# Altium footprint library разъёмы.PcbLib: 129 footprints (part 7 of 9)
Each footprint in its own frame and in the unit in brackets; x right, y up, seen from the top. Pads: shape width x height; smd on the part's side, far side on the other; paste and mask are expansions set on the pad; w line width, h text height; cw(c..) or ccw(c..) is an arc to the next point about the centre after c.
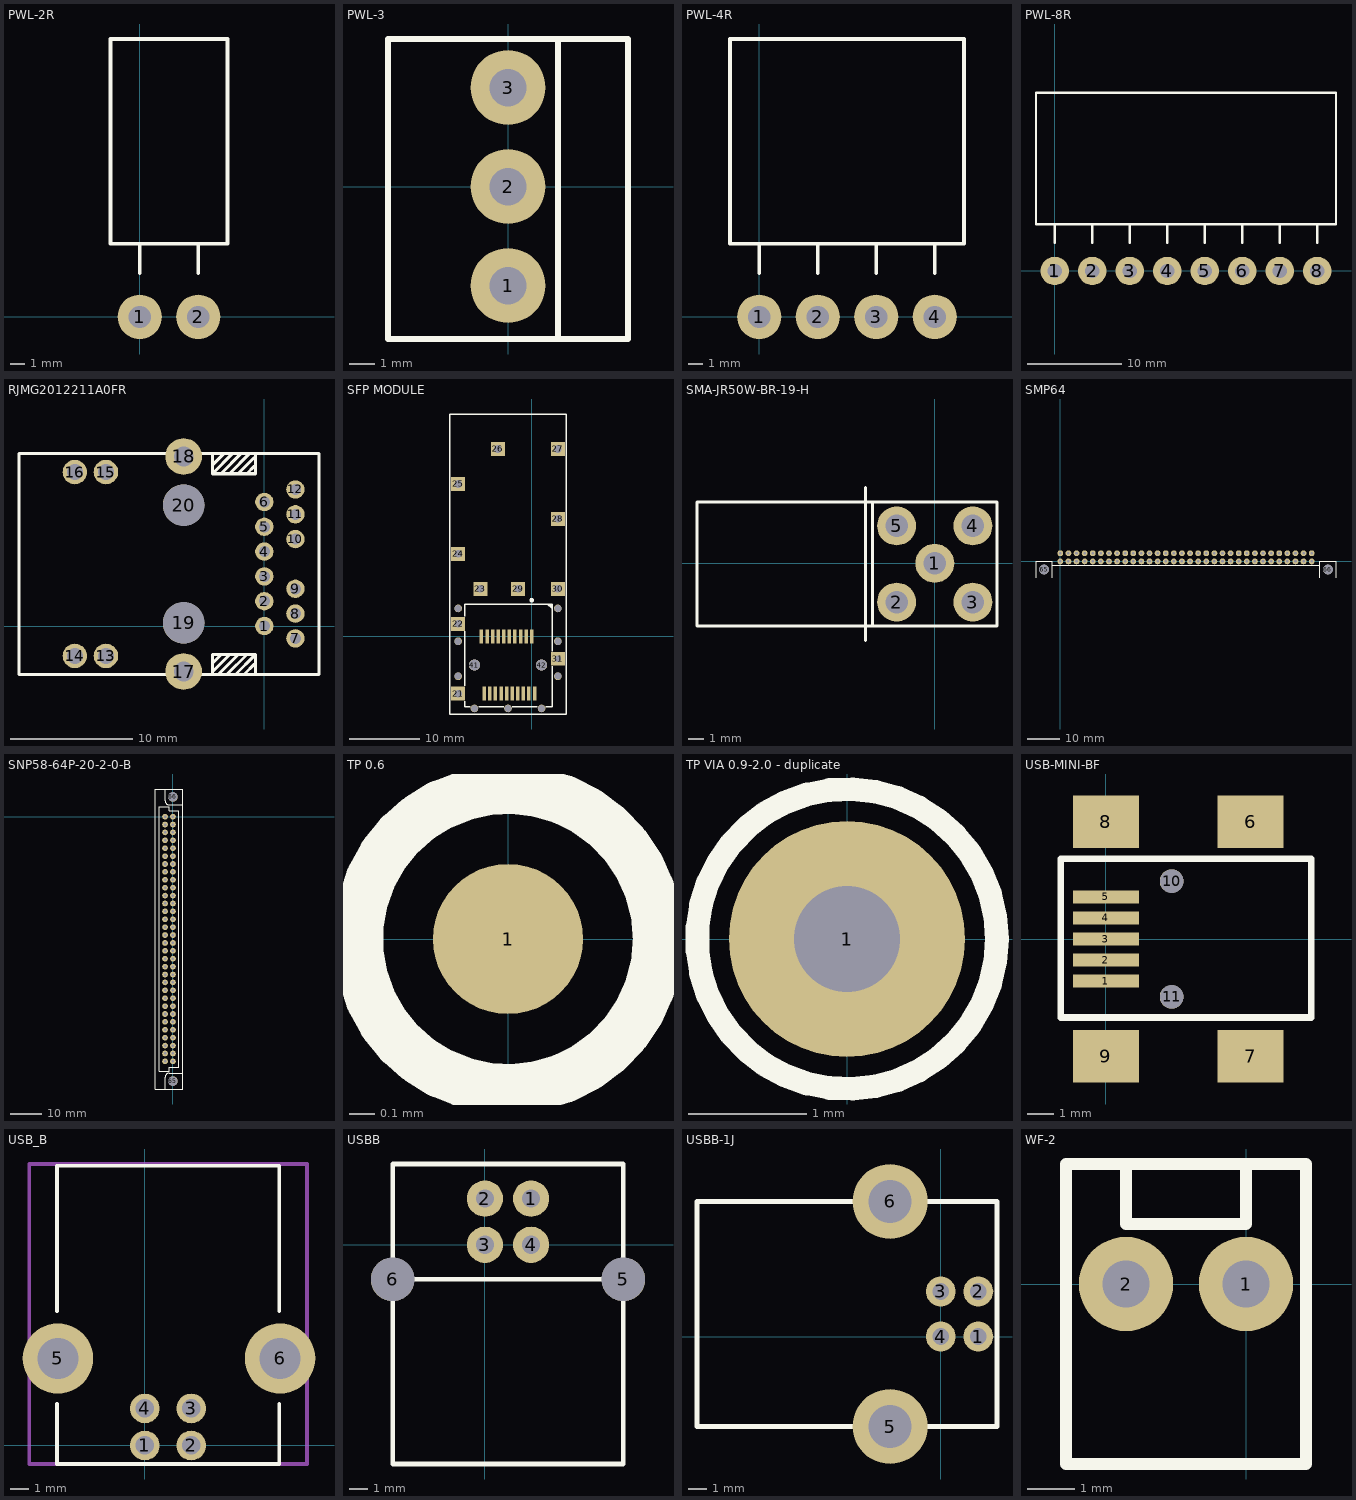
[diagram p6: the footprints below, top view; thin cyan lines are the x and y axes]

## PWL-2R [mm]
pads (2):
  round 3 hole 1.5: 1(0,0) 2(3.96,0)
Top Overlay:
  lines w0.254: 0,2.97 0,4.95 ; 3.96,2.97 3.96,4.95 ; -1.98,4.95 -1.98,18.81 5.94,18.81 5.94,4.95 -1.98,4.95

## PWL-3 [mm]
pads (3):
  round 3 hole 1.5: 1(0,-3.961) 2(0,0) 3(0,3.961)
Top Overlay:
  lines w0.254: 2,-6.002 2,5.802 ; -4.801,-6.101 -4.801,5.901 4.801,5.901 4.801,-6.101 -4.801,-6.101

## PWL-4R [mm]
pads (4):
  round 3 hole 1.5: 1(0,0) 2(3.96,0) 3(7.92,0) 4(11.88,0)
Top Overlay:
  lines w0.254: 0,2.97 0,4.95 ; 3.96,2.97 3.96,4.95 ; 7.92,2.97 7.92,4.95 ; 11.88,2.97 11.88,4.95 ; -1.98,4.95 13.86,4.95 13.86,18.81 -1.98,18.81 -1.98,4.95

## PWL-8R [mm]
pads (8):
  round 3 hole 1.5: 1(0,0) 2(3.96,0) 3(7.92,0) 4(11.88,0) 5(15.84,0) 6(19.8,0) 7(23.76,0) 8(27.72,0)
Top Overlay:
  lines w0.254: 0,2.97 0,4.95 ; 3.96,2.97 3.96,4.95 ; 7.92,2.97 7.92,4.95 ; 11.88,2.97 11.88,4.95 ; 15.84,2.97 15.84,4.95 ; 19.8,2.97 19.8,4.95 ; 23.76,2.97 23.76,4.95 ; 27.72,2.97 27.72,4.95 ; -1.98,4.95 -1.98,18.81 29.7,18.81 29.7,4.95 -1.98,4.95

## RJMG2012211A0FR [mm]
pads (20):
  round 1.5 hole 0.9: 1(0,0) 2(0,2.03) 3(0,4.06) 4(0,6.09) 5(0,8.12) 6(0,10.15) 7(2.54,-1.01) 8(2.54,1.02) 9(2.54,3.05) 10(2.54,7.11) 11(2.54,9.14) 12(2.54,11.17)
  round 2 hole 1.3: 13(-12.95,-2.445) 14(-15.49,-2.445) 15(-12.95,12.595) 16(-15.49,12.595)
  round 3 hole 1.6: 17(-6.6,-3.715) 18(-6.6,13.865)
  round 3.4 hole 3.4 unplated: 19(-6.6,0.255) 20(-6.6,9.895)
Top Overlay:
  lines w0.254: -4.23,-3.92 -4.23,-2.31 -0.73,-2.31 -0.73,-3.92 ; -4.23,12.455 -0.73,12.455 ; -4.23,12.47 -4.23,14.08 ; -4.22,12.48 -2.62,14.08 ; -4.22,13.18 -3.32,14.08 ; -4.12,-3.62 -2.82,-2.32 ; -4.12,-2.92 -3.52,-2.32 ; -3.72,-3.92 -2.12,-2.32 ; -3.52,12.48 -1.92,14.08 ; -3.02,-3.92 -1.42,-2.32 ; -2.82,12.48 -1.22,14.08 ; -2.32,-3.92 -0.82,-2.42 ; -2.12,12.48 -0.82,13.78 ; -1.62,-3.92 -0.82,-3.12 ; -1.42,12.48 -0.82,13.08 ; -0.73,12.47 -0.73,14.08 ; -20.06,-3.965 4.47,-3.965 4.47,14.115 -20.06,14.115 -20.06,-3.965

## SFP MODULE [mm]
pads (42):
  rect 0.5x2 smd: 1(0,0) 2(-0.798,0.004) 3(-1.597,0.001) 4(-2.398,0.001) 5(-3.195,0.004) 6(-3.996,0.001) 7(-4.797,0.001) 8(-5.595,0.004) 9(-6.396,0.001) 10(-7.197,0.001) 11(-6.798,-8.198) 12(-5.998,-8.198) 13(-5.197,-8.199) 14(-4.397,-8.199) 15(-3.6,-8.199) 16(-2.799,-8.199) 17(-1.997,-8.197) 18(-1.196,-8.197) 19(-0.398,-8.197) 20(0.401,-8.197)
  rect 2x2 hole 1.1: 21(-10.523,-8.199) 22(-10.523,1.801) 23(-7.348,6.801) 24(-10.523,11.801) 25(-10.523,21.801) 26(-4.848,26.801) 27(3.727,26.801) 28(3.727,16.801) 29(-1.948,6.801) 30(3.727,6.801)
  rect 2x2 hole 0.9: 31(3.727,-3.199)
  round 1.1 hole 1: 32(-10.523,-5.699) 33(-10.523,-0.699) 34(-10.523,4.001) 35(3.727,4.001) 36(3.727,-0.699) 37(3.727,-5.699) 38(1.402,-10.299) 39(-3.398,-10.299) 40(-8.198,-10.299)
  round 1.6 hole 1.6 unplated: 41(-8.198,-4.099) 42(1.402,-4.099)
Top Overlay:
  circle w0.3: c-0.002,5.188 r0.18
  lines w0.2: -9.592,-9.292 -9.592,-10.092 -8.815,-10.092 ; -9.592,-7.092 -9.592,0.708 ; -9.592,2.908 -9.592,4.608 2.908,4.608 2.908,-2.092 ; -7.584,-10.092 -4.017,-10.092 ; -2.783,-10.092 0.789,-10.092 ; 2.021,-10.092 2.908,-10.092 2.908,-4.292 ; 2.308,4.608 2.908,4.008 ; 2.608,4.608 2.908,4.308 ; -11.698,-11.099 4.902,-11.099 4.902,31.801 -11.698,31.801 -11.698,-11.099

## SMA-JR50W-BR-19-H [mm]
pads (5):
  round 2.6 hole 1.5: 1(0,0) 2(-2.54,-2.59) 3(2.54,-2.59) 4(2.54,2.49) 5(-2.54,2.49)
Top Overlay:
  lines w0.2: -4.6,-5.15 -4.6,5.05 ; -4.15,-4.2 -4.15,4.1 ; -4.15,-4.2 -15.85,-4.2 -15.85,4.1 -4.15,4.1 ; -4.15,-4.2 4.15,-4.2 4.15,4.1 -4.15,4.1

## SMP64 [mm]
pads (66):
  round 1.8 hole 0.8: 1(77.5,0) 2(75,0) 3(72.5,0) 4(70,0) 5(67.5,0) 6(65,0) 7(62.5,0) 8(60,0) 9(57.5,0) 10(55,0) 11(52.5,0) 12(50,0) 13(47.5,0) 14(45,0) 15(42.5,0) 16(40,0) 17(37.5,0) 18(35,0) 19(32.5,0) 20(30,0) 21(27.5,0) 22(25,0) 23(22.5,0) 24(20,0) 25(17.5,0) 26(15,0) 27(12.5,0) 28(10,0) 29(7.5,0) 30(5,0) 31(2.5,0) 32(0,0) 33(77.5,2.5) 34(75,2.5) 35(72.5,2.5) 36(70,2.5) 37(67.5,2.5) 38(65,2.5) 39(62.5,2.5) 40(60,2.5) 41(57.5,2.5) 42(55,2.5) 43(52.5,2.5) 44(50,2.5) 45(47.5,2.5) 46(45,2.5) 47(42.5,2.5) 48(40,2.5) 49(37.5,2.5) 50(35,2.5) 51(32.5,2.5) 52(30,2.5) 53(27.5,2.5) 54(25,2.5) 55(22.5,2.5) 56(20,2.5) 57(17.5,2.5) 58(15,2.5) 59(12.5,2.5) 60(10,2.5) 61(7.5,2.5) 62(5,2.5) 63(2.5,2.5) 64(0,2.5)
  round 3 hole 3: 65(-5,-2.5) 66(82.5,-2.5)
Top Overlay:
  lines w0.3: -7.5,-5 -7.5,0 -2.5,0 -2.5,-5 ; -2.5,-1.25 80,-1.25 ; 80,-5 80,0 85,0 85,-5

## SNP58-64P-20-2-0-B [mm]
pads (66):
  round 1.8 hole 0.8: 1(0,0) 2(0,-2.5) 3(0,-5) 4(0,-7.5) 5(0,-10) 6(0,-12.5) 7(0,-15) 8(0,-17.5) 9(0,-20) 10(0,-22.5) 11(0,-25) 12(0,-27.5) 13(0,-30) 14(0,-32.5) 15(0,-35) 16(0,-37.5) 17(0,-40) 18(0,-42.5) 19(0,-45) 20(0,-47.5) 21(0,-50) 22(0,-52.5) 23(0,-55) 24(0,-57.5) 25(0,-60) 26(0,-62.5) 27(0,-65) 28(0,-67.5) 29(0,-70) 30(0,-72.5) 31(0,-75) 32(0,-77.5) 33(-2.5,0) 34(-2.5,-2.5) 35(-2.5,-5) 36(-2.5,-7.5) 37(-2.5,-10) 38(-2.5,-12.5) 39(-2.5,-15) 40(-2.5,-17.5) 41(-2.5,-20) 42(-2.5,-22.5) 43(-2.5,-25) 44(-2.5,-27.5) 45(-2.5,-30) 46(-2.5,-32.5) 47(-2.5,-35) 48(-2.5,-37.5) 49(-2.5,-40) 50(-2.5,-42.5) 51(-2.5,-45) 52(-2.5,-47.5) 53(-2.5,-50) 54(-2.5,-52.5) 55(-2.5,-55) 56(-2.5,-57.5) 57(-2.5,-60) 58(-2.5,-62.5) 59(-2.5,-65) 60(-2.5,-67.5) 61(-2.5,-70) 62(-2.5,-72.5) 63(-2.5,-75) 64(-2.5,-77.5)
  round 3 hole 3: 65(0,-83.75) 66(0,6.25)
Top Overlay:
  lines w0.254: -2.5,-86.25 -2.5,-82.5 cw(c-1.25,-82.5) -1.25,-81.25 3.125,-81.25 ; -2.5,8.75 -2.5,5 ccw(c-1.25,5) -1.25,3.75 3.125,3.75 ; -5.625,-86.25 3.125,-86.25 3.125,8.75 -5.625,8.75 -5.625,-86.25 ; -4.375,-80.625 -4.375,3.125 -1.25,3.125 -1.25,1.875 1.875,1.875 1.875,-79.375 -1.25,-79.375 -1.25,-80.625 -4.375,-80.625

## TP 0.6 [mm] "Тестпоинт / Площадка D=0.6 мм без отверстия"
pads (1):
  round 0.6 smd: 1(0,0)
Top Overlay:
  circle w0.2: c0,0 r0.6

## TP VIA 0.9-2.0 - duplicate [mm] "Тестпоинт / Отверстие для пайки провода"
pads (1):
  round 2 hole 0.9: 1(0,0)
Top Overlay:
  circle w0.2: c0,0 r1.27

## USB-MINI-BF [mm]
pads (11):
  rect 2.5x0.5 smd: 1(0,-1.6) 2(0,-0.8) 3(0,0) 4(0,0.8) 5(0,1.6)
  rect 2.5x2 smd: 6(5.5,4.45) 7(5.5,-4.45) 8(0,4.45) 9(0,-4.45)
  round 0.9 hole 0.9: 10(2.5,2.2) 11(2.5,-2.2)
Top Overlay:
  lines w0.254: -1.717,-2.985 -1.717,3.047 7.808,3.047 7.808,-2.985 -1.717,-2.985

## USB_B [mm]
pads (6):
  round 1.6 hole 1: 1(0,0) 2(2.5,0) 3(2.5,2) 4(0,2)
  round 3.8 hole 2.2: 5(-4.7,4.7) 6(7.3,4.7)
Top Overlay:
  lines w0.2: -4.75,2.25 -4.75,-1 7.25,-1 7.25,2.25 ; -4.75,7.25 -4.75,15.1 7.25,15.1 7.25,7.25
Mechanical 13:
  lines w0.2: -6.25,-1 8.75,-1 8.75,15.2 -6.25,15.2 -6.25,-1
  text ".Designator" at 1.95,3.575 h1.5
3D body "USB-B-S-F-B-TH.STEP": height 10.75, standoff -3.47, extent -6.129,-1.05 8.73,15.25

## USBB [mm]
pads (6):
  round 2 hole 1: 1(2.54,2.54) 2(0,2.54) 3(0,0) 4(2.54,0)
  round 2.4 hole 2.4: 5(7.62,-1.905) 6(-5.08,-1.905)
Top Overlay:
  lines w0.254: -5.08,-1.905 7.62,-1.905 ; -5.08,-12.065 7.62,-12.065 7.62,4.445 -5.08,4.445 -5.08,-12.065

## USBB-1J [mm]
pads (6):
  round 1.6 hole 0.9: 1(2,0) 2(2,2.4) 3(0,2.4) 4(0,0)
  round 4 hole 2.3: 5(-2.7,-4.8) 6(-2.7,7.2)
Top Overlay:
  lines w0.254: -13,-4.8 -13,7.2 3,7.2 3,-4.8 -13,-4.8
3D body "USB type B 292304-1.SLDPRT": height 11.5, standoff -3.92, extent -13,-5.994 2.7,8.394

## WF-2 [mm]
pads (2):
  round 2 hole 1: 1(0,0) 2(-2.54,0)
Top Overlay:
  lines w0.254: -2.54,2.54 -2.54,1.27 0,1.27 0,2.54 ; -3.81,-3.81 -3.81,2.54 1.27,2.54 1.27,-3.81 -3.81,-3.81